# Altium footprint library Miscellaneous.PcbLib: 139 footprints (part 5 of 9)
Each footprint in its own frame and in the unit in brackets; x right, y up, seen from the top. Pads: shape width x height; smd on the part's side, far side on the other; paste and mask are expansions set on the pad; w line width, h text height; cw(c..) or ccw(c..) is an arc to the next point about the centre after c.
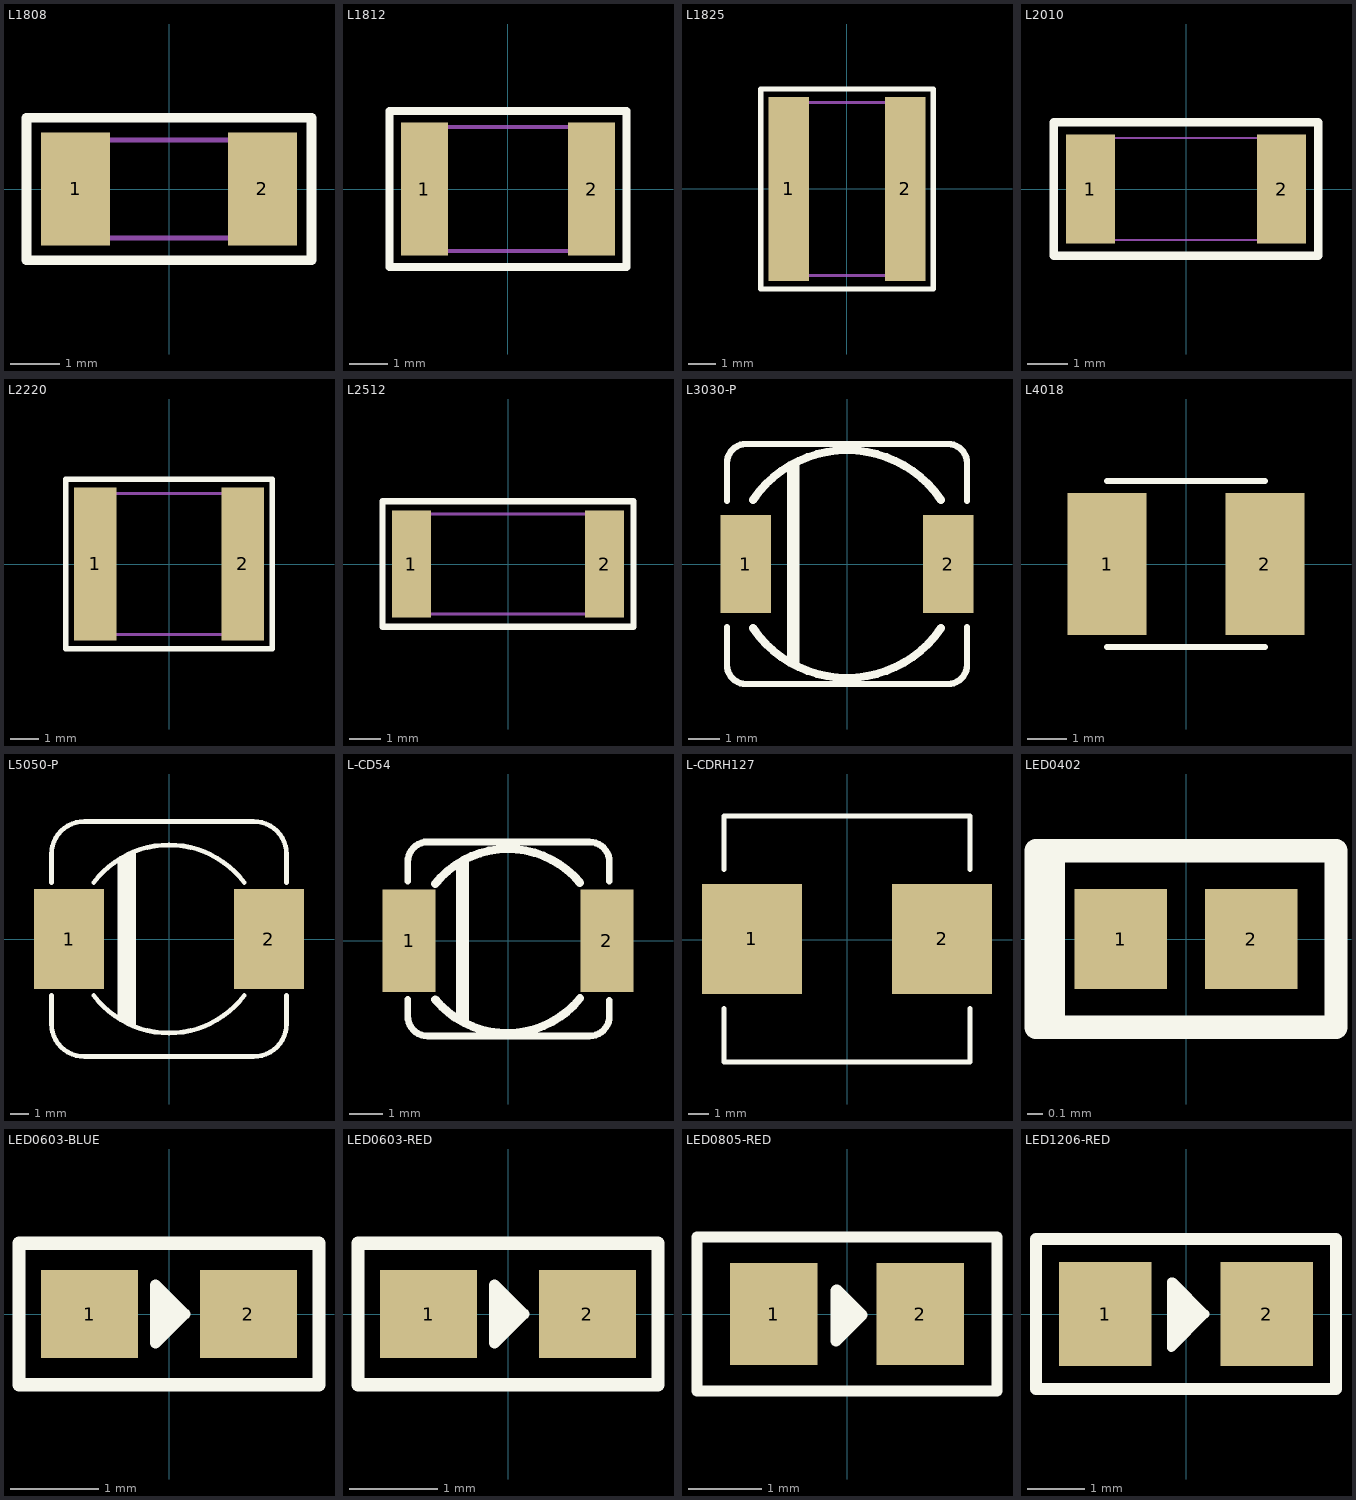
[diagram p4: the footprints below, top view; thin cyan lines are the x and y axes]

## L1808 [mm]
pads (2):
  rect 1.4x2.3 smd: 1(-1.9,0) 2(1.9,0)
Top Overlay:
  lines w0.2: -2.9,-1.45 -2.9,1.45 2.9,1.45 2.9,-1.45 -2.9,-1.45
Mechanical 13:
  lines w0.1: -2.25,-1 -2.25,1 2.25,1 2.25,-1 -2.25,-1

## L1812 [mm]
pads (2):
  rect 1.2x3.42 smd: 1(-2.15,0) 2(2.15,0)
Top Overlay:
  lines w0.2: -3.05,-2.01 3.05,-2.01 3.05,2.01 -3.05,2.01 -3.05,-2.01
Mechanical 13:
  lines w0.1: -2.25,-1.6 2.25,-1.6 2.25,1.6 -2.25,1.6 -2.25,-1.6

## L1825 [mm]
pads (2):
  rect 1.5x6.81 smd: 1(-2.15,0) 2(2.15,0)
Top Overlay:
  lines w0.2: -3.2,-3.705 3.2,-3.705 3.2,3.705 -3.2,3.705 -3.2,-3.705
Mechanical 13:
  lines w0.1: -2.3,-3.2 -2.3,3.2 2.3,3.2 2.3,-3.2 -2.3,-3.2

## L2010 [mm]
pads (2):
  rect 1.2x2.67 smd: 1(-2.34,0) 2(2.34,0)
Top Overlay:
  lines w0.2: -3.24,-1.635 3.24,-1.635 3.24,1.635 -3.24,1.635 -3.24,-1.635
Mechanical 13:
  lines w0.05: -2.5,-1.25 2.5,-1.25 2.5,1.25 -2.5,1.25 -2.5,-1.25

## L2220 [mm]
pads (2):
  rect 1.5x5.42 smd: 1(-2.62,0) 2(2.62,0)
Top Overlay:
  lines w0.2: -3.67,-3.01 3.67,-3.01 3.67,3.01 -3.67,3.01 -3.67,-3.01
Mechanical 13:
  lines w0.1: -2.9,-2.5 -2.9,2.5 2.9,2.5 2.9,-2.5 -2.9,-2.5

## L2512 [mm]
pads (2):
  rect 1.25x3.42 smd: 1(-3.1,0) 2(3.1,0)
Top Overlay:
  lines w0.2: -4.025,-2.01 4.025,-2.01 4.025,2.01 -4.025,2.01 -4.025,-2.01
Mechanical 13:
  lines w0.1: -3.15,-1.6 3.15,-1.6 3.15,1.6 -3.15,1.6 -3.15,-1.6

## L3030-P [mm]
pads (2):
  rect 1.6x3.1 smd: 1(-3.2,0) 2(3.2,0)
Top Overlay:
  rectangle: -1.9,-3.2 -1.5,3.2
  lines w0.203: -3.8,-2 -3.8,-3.2 ccw(c-3.2,-3.2) -3.2,-3.8 3.2,-3.8 ccw(c3.2,-3.2) 3.8,-3.2 3.8,-2 ; -3.8,2 -3.8,3.2 cw(c-3.2,3.2) -3.2,3.8 3.2,3.8 cw(c3.2,3.2) 3.8,3.2 3.8,2
  lines w0.254: -2.977,-2.034 ccw(c0,0) 2.977,-2.034 ; -2.977,2.034 cw(c0,0) 2.977,2.034
3D body "L3030 - RH.STEP": height 4.36, standoff 0, extent -3.5,-3.55 3.5,3.45

## L4018 [mm] "4.0*4.0*1.8"
pads (2):
  rect 2x3.6 smd: 1(-2,0) 2(2,0)
Top Overlay:
  lines w0.152: -2,-2.1 2,-2.1 ; -2,2.1 2,2.1
3D body "Coilcraft-LPZ4018.step": height 1.75, standoff -0.05, extent -1.962,-1.988 2.014,1.988

## L5050-P [mm]
pads (2):
  rect 3.8x5.4 smd: 1(-5.4,0) 2(5.4,0)
Top Overlay:
  lines w0.254: -6.35,-3.048 -6.35,-4.572 ccw(c-4.572,-4.572) -4.572,-6.35 4.572,-6.35 ccw(c4.572,-4.572) 6.35,-4.572 6.35,-3.048 ; -6.35,3.048 -6.35,4.572 cw(c-4.572,4.572) -4.572,6.35 4.572,6.35 cw(c4.572,4.572) 6.35,4.572 6.35,3.048 ; -4.064,-3.048 ccw(c0,0) 4.064,-3.048 ; -4.064,3.048 cw(c0,0) 4.064,3.048 ; -2.667,-4.318 -2.667,4.318 ; -2.413,-4.445 -2.413,4.445 ; -2.159,-4.572 -2.159,4.572 ; -1.905,-4.699 -1.905,4.699
3D body "L5050 - RH.STEP": height 6, standoff 0, extent -6.179,-5.969 6.121,6.331

## L-CD54 [mm]
pads (2):
  rect 1.6x3.1 smd: 1(-2.997,0) 2(2.997,0)
Top Overlay:
  rectangle: -1.575,-2.489 -1.175,2.438
  lines w0.203: -3.038,-1.778 -3.038,-2.292 ccw(c-2.438,-2.292) -2.438,-2.892 2.473,-2.892 ccw(c2.473,-2.292) 3.073,-2.292 3.073,-1.803 ; -3.038,1.803 -3.038,2.392 cw(c-2.438,2.392) -2.438,2.992 ; -2.54,2.992 2.473,2.992 cw(c2.473,2.392) 3.073,2.392 3.073,1.803
  lines w0.254: -2.21,1.722 cw(c0,-0.051) 2.178,1.76 ; -2.203,-1.786 ccw(c-0.025,0.025) 2.184,-1.747
3D body "L3030 - RH.STEP": height 4.36, standoff 0, extent -3.5,-3.55 3.5,3.45

## L-CDRH127 [mm] "12*12*7.8mm"
pads (2):
  rect 5x5.5 smd: 1(-4.75,0.025) 2(4.75,0.025)
Top Overlay:
  lines w0.254: -6.15,-3.45 -6.15,-6.125 6.15,-6.125 6.15,-3.45 ; -6.15,3.5 -6.15,6.175 6.15,6.175 6.15,3.5
3D body "User Library-CDRH127-2.step": height 7.8, standoff -0.2, extent -5.974,-5.975 6.026,6.025

## LED0402 [mm]
pads (2):
  rect 0.6x0.65 smd mask+0.051: 1(-0.425,0) 2(0.425,0)
Top Overlay:
  lines w0.152: -0.864,-0.55 -0.864,0.575 ; -0.975,-0.575 -0.975,0.575 0.975,0.575 0.975,-0.575 -0.975,-0.575
3D body "L0402.STEP": height 0.36, standoff -0.01, extent -0.512,-0.262 0.538,0.263

## LED0603-BLUE [mm]
pads (2):
  rect 1.1x1 smd: 1(-0.9,0) 2(0.9,0)
Top Overlay:
  lines w0.102: 0.025,-0.152 0.025,0 0.102,0.076 -0.025,0.076 ; -0.025,0 -0.025,0.076 ; -0.025,0 -0.025,-0.203 -0.076,-0.254 -0.076,0.127 -0.025,0.076 ; -0.025,0 -0.025,0.076
  lines w0.127: -0.152,-0.33 -0.152,0.33 0.178,0 -0.152,-0.33
  lines w0.152: -1.7,-0.8 1.7,-0.8 1.7,0.8 0.152,0.8 -1.7,0.8 -1.7,-0.8
3D body "User Library-LED_0603_B.STEP": height 0.6, standoff 0, extent -0.8,-0.425 0.8,0.375

## LED0603-RED [mm]
pads (2):
  rect 1.1x1 smd: 1(-0.9,0) 2(0.9,0)
Top Overlay:
  lines w0.102: 0.025,-0.152 0.025,0 0.102,0.076 -0.025,0.076 ; -0.025,0 -0.025,0.076 ; -0.025,0 -0.025,-0.203 -0.076,-0.254 -0.076,0.127 -0.025,0.076 ; -0.025,0 -0.025,0.076
  lines w0.127: -0.152,-0.33 -0.152,0.33 0.178,0 -0.152,-0.33
  lines w0.152: -1.7,-0.8 1.7,-0.8 1.7,0.8 0.152,0.8 -1.7,0.8 -1.7,-0.8
3D body "User Library-led0603_RED.step": height 1.1, standoff 0, extent -0.81,-0.4 0.81,0.4

## LED0805-RED [mm]
pads (2):
  rect 1.2x1.4 smd: 1(-1,0) 2(1,0)
Top Overlay:
  lines w0.102: -0.152,0.318 -0.152,0.102 0,-0.051 0,-0.216 ; 0.203,-0.013 0.025,-0.013 0,0.013 0,-0.216 ; 0,-0.216 0,0.191 -0.089,0.102 -0.089,-0.127 0,-0.216
  lines w0.152: -0.152,0.318 -0.152,-0.368 0.203,-0.013 -0.14,0.33 ; -2.05,-1.05 2.05,-1.05 2.05,1.05 -2.05,1.05 -2.05,-1.05

## LED1206-RED [mm]
pads (2):
  rect 1.6x1.8 smd: 1(-1.4,0) 2(1.4,0)
Top Overlay:
  lines w0.102: -0.165,-0.216 -0.165,0.051 -0.051,-0.064 -0.127,-0.064 -0.051,0.013 -0.051,0.165 ; -0.165,-0.216 0.025,-0.025 0.14,-0.025 ; -0.165,-0.216 -0.051,-0.216 -0.051,-0.076 0,-0.025 0,-0.165 0.14,-0.025 ; -0.165,-0.216 -0.051,-0.33 -0.051,0.33 0.305,-0.025 ; -0.165,0.267 -0.229,0.33 -0.216,0.33 -0.102,0.33 -0.051,0.381 ; -0.165,0.267 -0.152,0.267 0.14,-0.025 ; -0.165,0.267 -0.165,-0.495 -0.025,-0.356 -0.025,0.14 ; -0.165,0.267 -0.051,0.381 ; -0.051,0.165 -0.025,0.14 ; -0.051,0.165 -0.051,0.381 ; -0.051,0.165 -0.241,-0.025 0.305,-0.025 ; -0.051,0.381 -0.165,0.381 -0.051,0.267 -0.013,0.267 -0.025,0.254 -0.025,0.14 ; -0.025,0.14 0.114,0.14 0.14,0.114 0.14,-0.025 ; -0.025,0.14 0.14,-0.025 ; 0.14,-0.025 0.305,-0.025
  lines w0.152: -0.254,0.559 -0.254,-0.584 0.33,0 -0.229,0.559
  lines w0.203: -2.6,-1.3 -2.6,1.3 2.6,1.3 2.6,-1.3 -2.6,-1.3